# Altium footprint library pw.PcbLib: 210 footprints (part 4 of 14)
Each footprint in its own frame and in the unit in brackets; x right, y up, seen from the top. Pads: shape width x height; smd on the part's side, far side on the other; paste and mask are expansions set on the pad; w line width, h text height; cw(c..) or ccw(c..) is an arc to the next point about the centre after c.
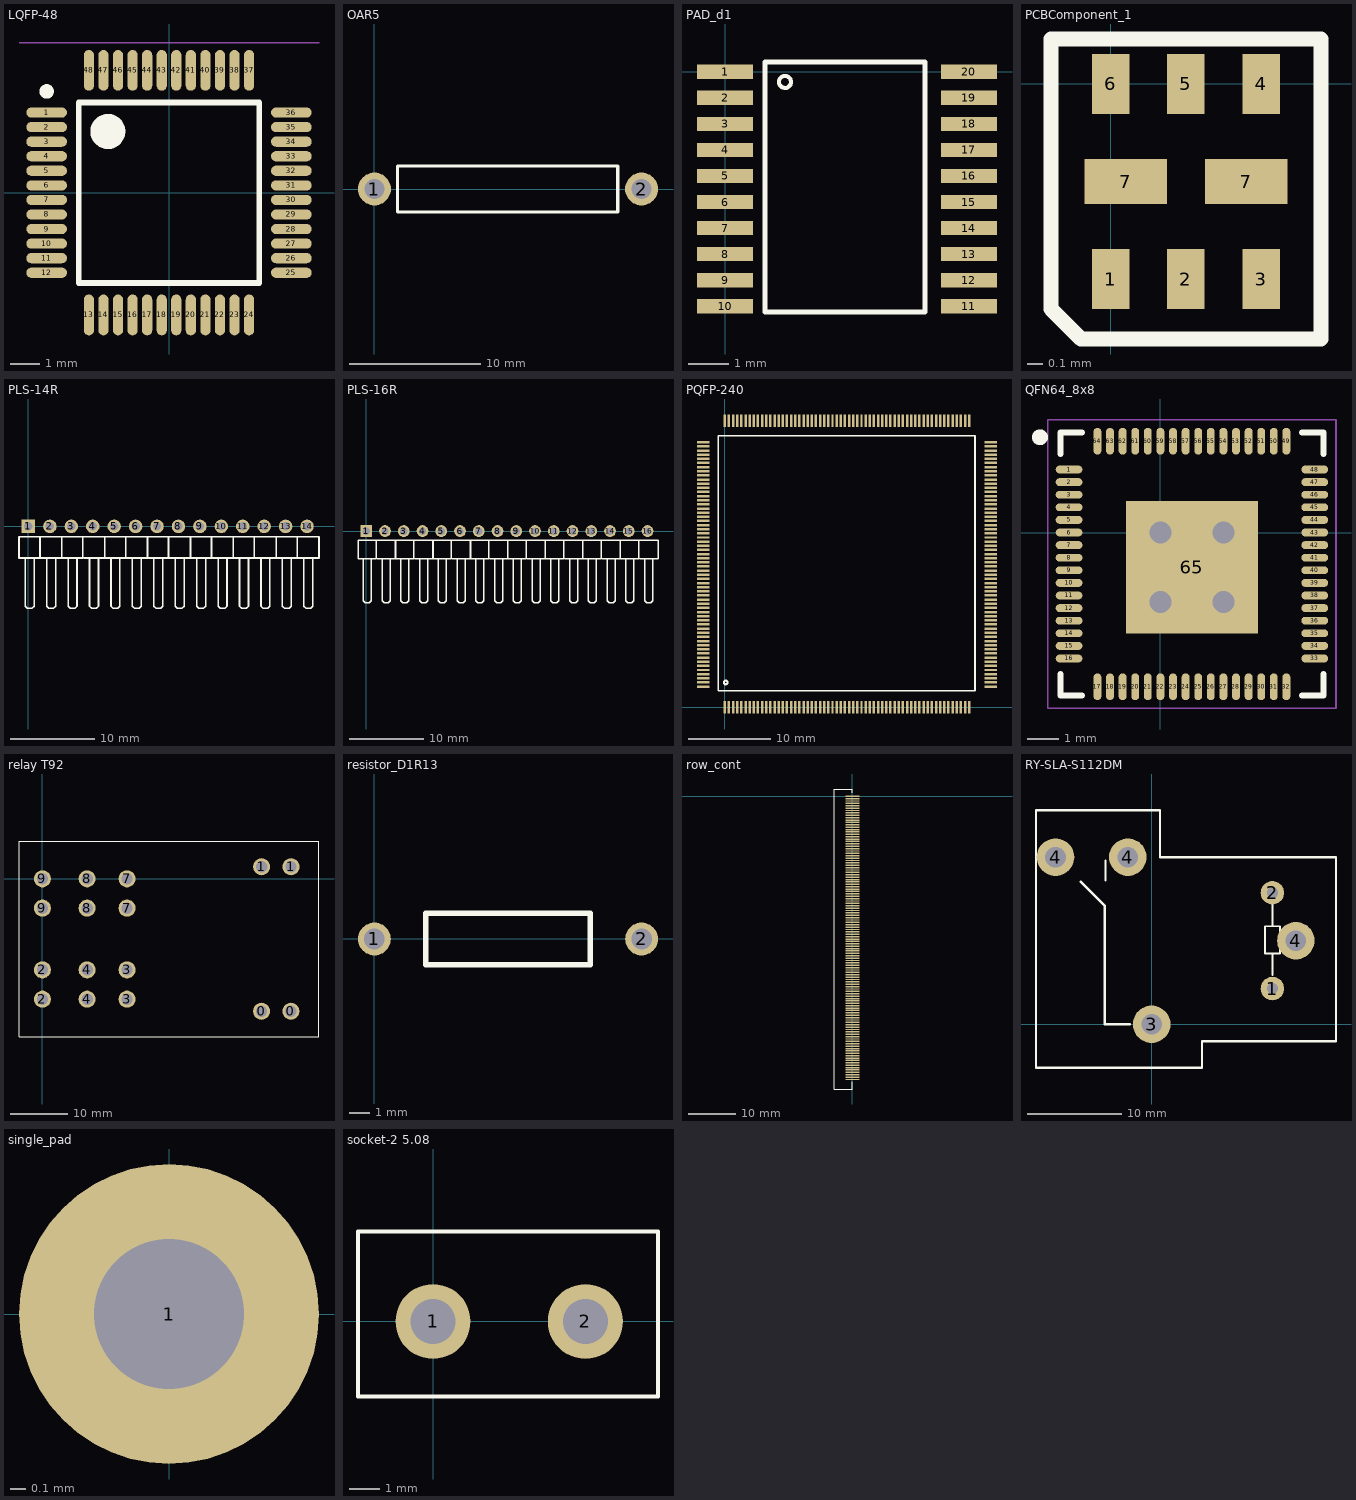
[diagram p3: the footprints below, top view; thin cyan lines are the x and y axes]

## LQFP-48 [mm] "TSQFP, 48-Leads, Body 7,00x7,00mm, Pitch 0,50mm, IPC Medium Density"
height 1.6
pads (48):
  oval 1.4x0.35 smd: 1(-4.2,2.75) 2(-4.2,2.25) 3(-4.2,1.75) 4(-4.2,1.25) 5(-4.2,0.75) 6(-4.2,0.25) 7(-4.2,-0.25) 8(-4.2,-0.75) 9(-4.2,-1.25) 10(-4.2,-1.75) 11(-4.2,-2.25) 12(-4.2,-2.75) 25(4.2,-2.75) 26(4.2,-2.25) 27(4.2,-1.75) 28(4.2,-1.25) 29(4.2,-0.75) 30(4.2,-0.25) 31(4.2,0.25) 32(4.2,0.75) 33(4.2,1.25) 34(4.2,1.75) 35(4.2,2.25) 36(4.2,2.75)
  oval 0.35x1.4 smd: 13(-2.75,-4.2) 14(-2.25,-4.2) 15(-1.75,-4.2) 16(-1.25,-4.2) 17(-0.75,-4.2) 18(-0.25,-4.2) 19(0.25,-4.2) 20(0.75,-4.2) 21(1.25,-4.2) 22(1.75,-4.2) 23(2.25,-4.2) 24(2.75,-4.2) 37(2.75,4.2) 38(2.25,4.2) 39(1.75,4.2) 40(1.25,4.2) 41(0.75,4.2) 42(0.25,4.2) 43(-0.25,4.2) 44(-0.75,4.2) 45(-1.25,4.2) 46(-1.75,4.2) 47(-2.25,4.2) 48(-2.75,4.2)
Top Overlay:
  circle w0.6: c-2.1,2.1 r0.3
  circle w0.25: c-4.2,3.475 r0.125
  lines w0.2: -3.1,-3.1 3.1,-3.1 3.1,3.1 -3.1,3.1 -3.1,-3.1
Mechanical 15:
  lines w0.05: -5.15,5.15 5.15,5.15
3D body "SW3dPS-LQFP48.STEP": height 1.5, standoff 0, extent -4.5,-4.5 4.5,4.5

## OAR5 [mm] "резистор"
pads (2):
  round 2.5 hole 1.5: 1(0,0) 2(20.3,0)
Top Overlay:
  lines w0.254: 1.75,-1.75 18.5,-1.75 18.5,1.75 7.063,1.75 1.75,1.75 1.75,-1.75
3D body "User Library-OAR5R005FLF.STEP": height 15.21, standoff -3.18, extent -0.8,-1.5 20.92,1.5

## PAD_d1 [mm] "d-1мм"
pads (20):
  rect 1.4x0.36 smd: 1(0,0) 2(0,-0.65) 3(0,-1.3) 4(0,-1.95) 5(0,-2.6) 6(0,-3.25) 7(0,-3.9) 8(0,-4.55) 9(0,-5.2) 10(0,-5.85) 11(6.095,-5.85) 12(6.095,-5.2) 13(6.095,-4.55) 14(6.095,-3.9) 15(6.095,-3.25) 16(6.095,-2.6) 17(6.095,-1.95) 18(6.095,-1.3) 19(6.095,-0.65) 20(6.095,0)
Top Overlay:
  circle w0.1: c1.5,-0.25 r0.15
  lines w0.125: 1,-6 5,-6 5,0.25 1,0.25 1,-6

## PCBComponent_1 [mm]
pads (8):
  rect 0.25x0.4 smd: 1(0,-1.3) 2(0.5,-1.3) 3(1,-1.3) 4(1,0) 5(0.5,0) 6(0,0)
  rect 0.55x0.3 smd: 7(0.1,-0.65) 7(0.9,-0.65)
Top Overlay:
  lines w0.1: -0.4,-1.5 -0.2,-1.7 1.4,-1.7 1.4,0.3 -0.4,0.3 -0.4,-1.5

## PCBComponent_1 - duplicate [mm]

## PCBComponent_1 - duplicate1 [mm]

## PLS-14R [mm]
pads (14):
  rect 1.6x1.6 hole 1: 1(0,0)
  round 1.6 hole 1: 2(2.54,0) 3(5.08,0) 4(7.62,0) 5(10.16,0) 6(12.7,0) 7(15.24,0) 8(17.78,0) 9(20.32,0) 10(22.86,0) 11(25.4,0) 12(27.94,0) 13(30.48,0) 14(33.02,0)
Top Overlay:
  lines w0.2: -1.12,-3.74 -1.12,-1.24 1.37,-1.24 1.37,-3.74 -1.08,-3.74 ; -0.38,-3.75 -0.38,-9.47 -0.13,-9.72 0.43,-9.72 0.68,-9.47 0.68,-3.75 ; 1.42,-1.24 3.96,-1.24 ; 1.46,-3.74 3.96,-3.74 ; 2.16,-3.74 2.16,-9.46 2.41,-9.71 2.97,-9.71 3.22,-9.46 3.22,-3.74 ; 4,-3.74 6.45,-3.74 6.45,-1.24 3.96,-1.24 ; 4.7,-3.75 4.7,-9.47 4.95,-9.72 5.51,-9.72 5.76,-9.47 5.76,-3.75 ; 6.5,-1.24 9.04,-1.24 ; 6.54,-3.74 9.04,-3.74 ; 7.24,-3.74 7.24,-9.46 7.49,-9.71 8.05,-9.71 8.3,-9.46 8.3,-3.74 ; 9.08,-3.74 11.53,-3.74 11.53,-1.241 9.04,-1.241 ; 9.78,-3.75 9.78,-9.47 10.03,-9.72 10.59,-9.72 10.84,-9.47 10.84,-3.75 ; 11.58,-1.241 14.12,-1.241 ; 11.62,-3.74 14.12,-3.74 ; 12.32,-3.74 12.32,-9.46 12.57,-9.71 13.13,-9.71 13.38,-9.46 13.38,-3.74 ; 14.16,-3.74 16.61,-3.74 16.61,-1.24 14.12,-1.24 ; 14.86,-3.75 14.86,-9.47 15.11,-9.72 15.67,-9.72 15.92,-9.47 15.92,-3.75 ; 16.66,-1.24 19.2,-1.24 ; 16.7,-3.74 19.2,-3.74 ; 17.4,-3.74 17.4,-9.46 17.65,-9.71 18.21,-9.71 18.46,-9.46 18.46,-3.74 ; 19.24,-3.74 21.69,-3.74 21.69,-1.24 19.2,-1.24 ; 19.94,-3.75 19.94,-9.47 20.19,-9.72 20.75,-9.72 21,-9.47 21,-3.75 ; 21.74,-1.24 24.28,-1.24 ; 21.78,-3.74 24.28,-3.74 ; 22.48,-3.74 22.48,-9.46 22.73,-9.71 23.29,-9.71 23.54,-9.46 23.54,-3.74 ; 24.32,-3.74 26.77,-3.74 26.77,-1.24 24.28,-1.24 ; 25.02,-3.75 25.02,-9.47 25.27,-9.72 25.83,-9.72 26.08,-9.47 26.08,-3.75 ; 26.82,-1.24 29.36,-1.24 ; 26.86,-3.74 29.36,-3.74 ; 27.56,-3.74 27.56,-9.46 27.81,-9.71 28.37,-9.71 28.62,-9.46 28.62,-3.74 ; 29.4,-3.74 31.85,-3.74 31.85,-1.24 29.36,-1.24 ; 30.1,-3.75 30.1,-9.47 30.35,-9.72 30.91,-9.72 31.16,-9.47 31.16,-3.75 ; 31.9,-1.24 34.44,-1.24 ; 31.94,-3.74 34.44,-3.74 ; 32.64,-3.74 32.64,-9.46 32.89,-9.71 33.45,-9.71 33.7,-9.46 33.7,-3.74 ; 3.96,-3.74 3.96,-1.24 ; 3.96,-3.74 3.96,-1.24 ; 9.04,-3.74 9.04,-1.241 ; 9.04,-3.74 9.04,-1.24 ; 14.12,-3.74 14.12,-1.24 ; 14.12,-3.74 14.12,-1.241 ; 19.2,-3.74 19.2,-1.24 ; 19.2,-3.74 19.2,-1.24 ; 24.28,-3.74 24.28,-1.24 ; 24.28,-3.74 24.28,-1.24 ; 29.36,-3.74 29.36,-1.24 ; 29.36,-3.74 29.36,-1.24 ; 34.44,-3.74 34.44,-1.24 ; 34.44,-3.74 34.44,-1.24
3D body "PLS-5R.STEP": height 2.44, standoff -3.05, extent -1.25,-9.72 11.45,0.5
3D body "PLS-5R.STEP": height 2.44, standoff -3.05, extent 11.45,-9.72 24.15,0.5
3D body "PLS-5R.STEP": height 2.44, standoff -3.05, extent 21.65,-9.72 34.35,0.5

## PLS-16R [mm]
pads (16):
  rect 1.6x1.6 hole 1: 1(0,0)
  round 1.6 hole 1: 2(2.54,0) 3(5.08,0) 4(7.62,0) 5(10.16,0) 6(12.7,0) 7(15.24,0) 8(17.78,0) 9(20.32,0) 10(22.86,0) 11(25.4,0) 12(27.94,0) 13(30.48,0) 14(33.02,0) 15(35.56,0) 16(38.1,0)
Top Overlay:
  lines w0.2: -1.12,-3.74 -1.12,-1.24 1.37,-1.24 1.37,-3.74 -1.08,-3.74 ; -0.38,-3.75 -0.38,-9.47 -0.13,-9.72 0.43,-9.72 0.68,-9.47 0.68,-3.75 ; 1.42,-1.24 3.96,-1.24 ; 1.46,-3.74 3.96,-3.74 ; 2.16,-3.74 2.16,-9.46 2.41,-9.71 2.97,-9.71 3.22,-9.46 3.22,-3.74 ; 4,-3.74 6.45,-3.74 6.45,-1.24 3.96,-1.24 ; 4.7,-3.75 4.7,-9.47 4.95,-9.72 5.51,-9.72 5.76,-9.47 5.76,-3.75 ; 6.5,-1.24 9.04,-1.24 ; 6.54,-3.74 9.04,-3.74 ; 7.24,-3.74 7.24,-9.46 7.49,-9.71 8.05,-9.71 8.3,-9.46 8.3,-3.74 ; 9.08,-3.74 11.53,-3.74 11.53,-1.241 9.04,-1.241 ; 9.78,-3.75 9.78,-9.47 10.03,-9.72 10.59,-9.72 10.84,-9.47 10.84,-3.75 ; 11.58,-1.241 14.12,-1.241 ; 11.62,-3.74 14.12,-3.74 ; 12.32,-3.74 12.32,-9.46 12.57,-9.71 13.13,-9.71 13.38,-9.46 13.38,-3.74 ; 14.16,-3.74 16.61,-3.74 16.61,-1.24 14.12,-1.24 ; 14.86,-3.75 14.86,-9.47 15.11,-9.72 15.67,-9.72 15.92,-9.47 15.92,-3.75 ; 16.66,-1.24 19.2,-1.24 ; 16.7,-3.74 19.2,-3.74 ; 17.4,-3.74 17.4,-9.46 17.65,-9.71 18.21,-9.71 18.46,-9.46 18.46,-3.74 ; 19.24,-3.74 21.69,-3.74 21.69,-1.24 19.2,-1.24 ; 19.94,-3.75 19.94,-9.47 20.19,-9.72 20.75,-9.72 21,-9.47 21,-3.75 ; 21.74,-1.24 24.28,-1.24 ; 21.78,-3.74 24.28,-3.74 ; 22.48,-3.74 22.48,-9.46 22.73,-9.71 23.29,-9.71 23.54,-9.46 23.54,-3.74 ; 24.32,-3.74 26.77,-3.74 26.77,-1.24 24.28,-1.24 ; 25.02,-3.75 25.02,-9.47 25.27,-9.72 25.83,-9.72 26.08,-9.47 26.08,-3.75 ; 26.82,-1.24 29.36,-1.24 ; 26.86,-3.74 29.36,-3.74 ; 27.56,-3.74 27.56,-9.46 27.81,-9.71 28.37,-9.71 28.62,-9.46 28.62,-3.74 ; 29.4,-3.74 31.85,-3.74 31.85,-1.24 29.36,-1.24 ; 30.1,-3.75 30.1,-9.47 30.35,-9.72 30.91,-9.72 31.16,-9.47 31.16,-3.75 ; 31.9,-1.24 34.44,-1.24 ; 31.94,-3.74 34.44,-3.74 ; 32.64,-3.74 32.64,-9.46 32.89,-9.71 33.45,-9.71 33.7,-9.46 33.7,-3.74 ; 34.48,-3.74 36.93,-3.74 36.93,-1.24 34.44,-1.24 ; 35.18,-3.75 35.18,-9.47 35.43,-9.72 35.99,-9.72 36.24,-9.47 36.24,-3.75 ; 36.98,-1.24 39.52,-1.24 39.52,-3.74 37.02,-3.74 ; 37.72,-3.74 37.72,-9.46 37.97,-9.71 38.53,-9.71 38.78,-9.46 38.78,-3.74 ; 3.96,-3.74 3.96,-1.24 ; 3.96,-3.74 3.96,-1.24 ; 9.04,-3.74 9.04,-1.24 ; 9.04,-3.74 9.04,-1.241 ; 14.12,-3.74 14.12,-1.241 ; 14.12,-3.74 14.12,-1.24 ; 19.2,-3.74 19.2,-1.24 ; 19.2,-3.74 19.2,-1.24 ; 24.28,-3.74 24.28,-1.24 ; 24.28,-3.74 24.28,-1.24 ; 29.36,-3.74 29.36,-1.24 ; 29.36,-3.74 29.36,-1.24 ; 34.44,-3.74 34.44,-1.24 ; 34.44,-3.74 34.44,-1.24
3D body "PLS-5R.STEP": height 2.44, standoff -3.05, extent 26.75,-9.72 39.45,0.5
3D body "PLS-5R.STEP": height 2.44, standoff -3.05, extent 24.15,-9.72 36.85,0.5
3D body "PLS-5R.STEP": height 2.44, standoff -3.05, extent 11.45,-9.72 24.15,0.5
3D body "PLS-5R.STEP": height 2.44, standoff -3.05, extent -1.25,-9.72 11.45,0.5

## PQFP-240 [mm]
pads (240):
  rect 1.524x0.3 smd: 1(-2.6,2.5) 1(-2.6,3) 1(-2.6,3.5) 1(-2.6,4) 1(-2.6,4.5) 1(-2.6,5) 1(-2.6,5.5) 1(-2.6,6) 1(-2.6,6.5) 1(-2.6,7) 1(-2.6,7.5) 1(-2.6,8) 1(-2.6,8.5) 1(-2.6,9) 1(-2.6,9.5) 1(-2.6,10) 1(-2.6,10.5) 1(-2.6,11) 1(-2.6,11.5) 1(-2.6,12) 1(-2.6,12.5) 1(-2.6,13) 1(-2.6,13.5) 1(-2.6,14) 1(-2.6,14.5) 1(-2.6,15) 1(-2.6,15.5) 1(-2.6,16) 1(-2.6,16.5) 1(-2.6,17) 1(-2.6,17.5) 1(-2.6,18) 1(-2.6,18.5) 1(-2.6,19) 1(-2.6,19.5) 1(-2.6,20) 1(-2.6,20.5) 1(-2.6,21) 1(-2.6,21.5) 1(-2.6,22) 1(-2.6,22.5) 1(-2.6,23) 1(-2.6,23.5) 1(-2.6,24) 1(-2.6,24.5) 1(-2.6,25) 1(-2.6,25.5) 1(-2.6,26) 1(-2.6,26.5) 1(-2.6,27) 1(-2.6,27.5) 1(-2.6,28) 1(-2.6,28.5) 1(-2.6,29) 1(-2.6,29.5) 1(-2.6,30) 1(-2.6,30.5) 1(-2.6,31) 1(-2.6,31.5) 1(-2.6,32) 1(32.1,2.5) 1(32.1,3) 1(32.1,3.5) 1(32.1,4) 1(32.1,4.5) 1(32.1,5) 1(32.1,5.5) 1(32.1,6) 1(32.1,6.5) 1(32.1,7) 1(32.1,7.5) 1(32.1,8) 1(32.1,8.5) 1(32.1,9) 1(32.1,9.5) 1(32.1,10) 1(32.1,10.5) 1(32.1,11) 1(32.1,11.5) 1(32.1,12) 1(32.1,12.5) 1(32.1,13) 1(32.1,13.5) 1(32.1,14) 1(32.1,14.5) 1(32.1,15) 1(32.1,15.5) 1(32.1,16) 1(32.1,16.5) 1(32.1,17) 1(32.1,17.5) 1(32.1,18) 1(32.1,18.5) 1(32.1,19) 1(32.1,19.5) 1(32.1,20) 1(32.1,20.5) 1(32.1,21) 1(32.1,21.5) 1(32.1,22) 1(32.1,22.5) 1(32.1,23) 1(32.1,23.5) 1(32.1,24) 1(32.1,24.5) 1(32.1,25) 1(32.1,25.5) 1(32.1,26) 1(32.1,26.5) 1(32.1,27) 1(32.1,27.5) 1(32.1,28) 1(32.1,28.5) 1(32.1,29) 1(32.1,29.5) 1(32.1,30) 1(32.1,30.5) 1(32.1,31) 1(32.1,31.5) 1(32.1,32)
  rect 0.3x1.524 smd: 1(0,0) 1(0,34.6) 1(0.5,0) 1(0.5,34.6) 1(1,0) 1(1,34.6) 1(1.5,0) 1(1.5,34.6) 1(2,0) 1(2,34.6) 1(2.5,0) 1(2.5,34.6) 1(3,0) 1(3,34.6) 1(3.5,0) 1(3.5,34.6) 1(4,0) 1(4,34.6) 1(4.5,0) 1(4.5,34.6) 1(5,0) 1(5,34.6) 1(5.5,0) 1(5.5,34.6) 1(6,0) 1(6,34.6) 1(6.5,0) 1(6.5,34.6) 1(7,0) 1(7,34.6) 1(7.5,0) 1(7.5,34.6) 1(8,0) 1(8,34.6) 1(8.5,0) 1(8.5,34.6) 1(9,0) 1(9,34.6) 1(9.5,0) 1(9.5,34.6) 1(10,0) 1(10,34.6) 1(10.5,0) 1(10.5,34.6) 1(11,0) 1(11,34.6) 1(11.5,0) 1(11.5,34.6) 1(12,0) 1(12,34.6) 1(12.5,0) 1(12.5,34.6) 1(13,0) 1(13,34.6) 1(13.5,0) 1(13.5,34.6) 1(14,0) 1(14,34.6) 1(14.5,0) 1(14.5,34.6) 1(15,0) 1(15,34.6) 1(15.5,0) 1(15.5,34.6) 1(16,0) 1(16,34.6) 1(16.5,0) 1(16.5,34.6) 1(17,0) 1(17,34.6) 1(17.5,0) 1(17.5,34.6) 1(18,0) 1(18,34.6) 1(18.5,0) 1(18.5,34.6) 1(19,0) 1(19,34.6) 1(19.5,0) 1(19.5,34.6) 1(20,0) 1(20,34.6) 1(20.5,0) 1(20.5,34.6) 1(21,0) 1(21,34.6) 1(21.5,0) 1(21.5,34.6) 1(22,0) 1(22,34.6) 1(22.5,0) 1(22.5,34.6) 1(23,0) 1(23,34.6) 1(23.5,0) 1(23.5,34.6) 1(24,0) 1(24,34.6) 1(24.5,0) 1(24.5,34.6) 1(25,0) 1(25,34.6) 1(25.5,0) 1(25.5,34.6) 1(26,0) 1(26,34.6) 1(26.5,0) 1(26.5,34.6) 1(27,0) 1(27,34.6) 1(27.5,0) 1(27.5,34.6) 1(28,0) 1(28,34.6) 1(28.5,0) 1(28.5,34.6) 1(29,0) 1(29,34.6) 1(29.5,0) 1(29.5,34.6)
Top Overlay:
  circle w0.254: c0.1,3 r0.224
  lines w0.2: -0.8,2 30.2,2 30.2,32.8 -0.8,32.8 -0.8,2
3D body "User Library-IPC QFP24QFP50P3460X3460X415-240N  240 MQFP.STEP": height 4.3, standoff 0, extent -2.6,-0.1 32.056,34.556

## QFN64_8x8 [mm] "micrel"
height 0.85
pads (65):
  oval 0.85x0.25 smd: 1(-2.9,2) 2(-2.9,1.6) 3(-2.9,1.2) 4(-2.9,0.8) 5(-2.9,0.4) 6(-2.9,0) 7(-2.9,-0.4) 8(-2.9,-0.8) 9(-2.9,-1.2) 10(-2.9,-1.6) 11(-2.9,-2) 12(-2.9,-2.4) 13(-2.9,-2.8) 14(-2.9,-3.2) 15(-2.9,-3.6) 16(-2.9,-4) 33(4.9,-4) 34(4.9,-3.6) 35(4.9,-3.2) 36(4.9,-2.8) 37(4.9,-2.4) 38(4.9,-2) 39(4.9,-1.6) 40(4.9,-1.2) 41(4.9,-0.8) 42(4.9,-0.4) 43(4.9,0) 44(4.9,0.4) 45(4.9,0.8) 46(4.9,1.2) 47(4.9,1.6) 48(4.9,2)
  oval 0.25x0.85 smd: 17(-2,-4.9) 18(-1.6,-4.9) 19(-1.2,-4.9) 20(-0.8,-4.9) 21(-0.4,-4.9) 22(0,-4.9) 23(0.4,-4.9) 24(0.8,-4.9) 25(1.2,-4.9) 26(1.6,-4.9) 27(2,-4.9) 28(2.4,-4.9) 29(2.8,-4.9) 30(3.2,-4.9) 31(3.6,-4.9) 32(4,-4.9) 49(4,2.9) 50(3.6,2.9) 51(3.2,2.9) 52(2.8,2.9) 53(2.4,2.9) 54(2,2.9) 55(1.6,2.9) 56(1.2,2.9) 57(0.8,2.9) 58(0.4,2.9) 59(0,2.9) 60(-0.4,2.9) 61(-0.8,2.9) 62(-1.2,2.9) 63(-1.6,2.9) 64(-2,2.9)
  rect 4.2x4.2 smd: 65(1,-1.1)
via 0,0 diameter 1.3 hole 0.7
via 2,0 diameter 1.3 hole 0.7
via 2,-2.2 diameter 1.3 hole 0.7
via 0,-2.2 diameter 1.3 hole 0.7
Top Overlay:
  circle w0.25: c-3.825,3.025 r0.125
  lines w0.2: -3.175,-4.5 -3.175,-5.175 -2.5,-5.175 ; -3.175,2.5 -3.175,3.175 -2.5,3.175 ; 4.5,-5.175 5.175,-5.175 5.175,-4.5 ; 4.5,3.175 5.175,3.175 5.175,2.5
Mechanical 15:
  lines w0.05: -3.575,-5.575 5.575,-5.575 5.575,3.575 -3.575,3.575 -3.575,-5.575
  lines w0.1: 0.5,-1 1.5,-1 ; 1,-1.5 1,-0.5
3D body "User Library-QFN 64 8x8.STEP": height 0.8, standoff -0.05, extent -2.952,-4.975 5.05,3.027

## relay T92 [mm]
pads (16):
  round 3 hole 2: 0(38.5,-23.28) 0(43.66,-23.28) 1(38.52,2.12) 1(43.68,2.12) 2(0,-21.16) 2(0,-16) 3(14.86,-21.16) 3(14.86,-16) 4(7.85,-21.16) 4(7.85,-16) 7(14.86,-5.16) 7(14.86,0) 8(7.85,-5.16) 8(7.85,0) 9(0,-5.16) 9(0,0)
Top Overlay:
  lines w0.2: 48.58,6.62 48.58,-27.78 -4.12,-27.78 -4.12,6.62 48.6,6.62
3D body "66f3421_t92s7a12-240.stp": height 31.42, standoff -3.28, extent -3.762,-27.972 48.562,6.572

## resistor_D1R13 [mm]
pads (2):
  round 1.6 hole 1: 1(0,0) 2(13,0)
Top Overlay:
  lines w0.254: 2.5,-1.25 2.5,1.25 10.5,1.25 10.5,-1.25 2.5,-1.25

## row_cont [mm]
pads (120):
  rect 3x0.3 smd: 1(0,-59.5) 1(0,-59) 1(0,-58.5) 1(0,-58) 1(0,-57.5) 1(0,-57) 1(0,-56.5) 1(0,-56) 1(0,-55.5) 1(0,-55) 1(0,-54.5) 1(0,-54) 1(0,-53.5) 1(0,-53) 1(0,-52.5) 1(0,-52) 1(0,-51.5) 1(0,-51) 1(0,-50.5) 1(0,-50) 1(0,-49.5) 1(0,-49) 1(0,-48.5) 1(0,-48) 1(0,-47.5) 1(0,-47) 1(0,-46.5) 1(0,-46) 1(0,-45.5) 1(0,-45) 1(0,-44.5) 1(0,-44) 1(0,-43.5) 1(0,-43) 1(0,-42.5) 1(0,-42) 1(0,-41.5) 1(0,-41) 1(0,-40.5) 1(0,-40) 1(0,-39.5) 1(0,-39) 1(0,-38.5) 1(0,-38) 1(0,-37.5) 1(0,-37) 1(0,-36.5) 1(0,-36) 1(0,-35.5) 1(0,-35) 1(0,-34.5) 1(0,-34) 1(0,-33.5) 1(0,-33) 1(0,-32.5) 1(0,-32) 1(0,-31.5) 1(0,-31) 1(0,-30.5) 1(0,-30) 1(0,-29.5) 1(0,-29) 1(0,-28.5) 1(0,-28) 1(0,-27.5) 1(0,-27) 1(0,-26.5) 1(0,-26) 1(0,-25.5) 1(0,-25) 1(0,-24.5) 1(0,-24) 1(0,-23.5) 1(0,-23) 1(0,-22.5) 1(0,-22) 1(0,-21.5) 1(0,-21) 1(0,-20.5) 1(0,-20) 1(0,-19.5) 1(0,-19) 1(0,-18.5) 1(0,-18) 1(0,-17.5) 1(0,-17) 1(0,-16.5) 1(0,-16) 1(0,-15.5) 1(0,-15) 1(0,-14.5) 1(0,-14) 1(0,-13.5) 1(0,-13) 1(0,-12.5) 1(0,-12) 1(0,-11.5) 1(0,-11) 1(0,-10.5) 1(0,-10) 1(0,-9.5) 1(0,-9) 1(0,-8.5) 1(0,-8) 1(0,-7.5) 1(0,-7) 1(0,-6.5) 1(0,-6) 1(0,-5.5) 1(0,-5) 1(0,-4.5) 1(0,-4) 1(0,-3.5) 1(0,-3) 1(0,-2.5) 1(0,-2) 1(0,-1.5) 1(0,-1) 1(0,-0.5) 1(0,0)
Top Overlay:
  lines w0.2: 0,-60 0,-61.5 -3.8,-61.5 -3.8,1.52 0,1.52 0,0.76

## RY-SLA-S112DM [mm] "реле"
pads (6):
  round 2.5 hole 1.2: 1(12.86,3.8) 2(12.86,14)
  round 4 hole 2.2: 3(0,0) 4(-10.24,17.8) 4(-2.54,17.8) 4(15.36,8.9)
Top Overlay:
  lines w0.2: -12.319,-4.648 -12.319,22.809 ; -4.902,15.291 -4.902,17.453 ; 12.874,5.244 12.874,7.519 ; 12.874,10.444 12.874,12.744 ; 19.634,-1.829 19.634,17.78 ; 12.074,7.519 12.074,10.444 13.674,10.444 13.674,7.519 12.074,7.519
  lines w0.254: -12.319,-4.648 5.359,-4.648 5.359,-1.829 19.634,-1.829 ; -12.319,22.809 0.889,22.809 0.889,17.78 19.634,17.78 ; -7.57,15.2 -4.978,12.608 -4.978,0 -2.337,0
3D body "User Library-RELAY-RT1-24-30-A.STEP": height 20.2, standoff -2.8, extent -12.5,-4.5 19.5,22.5

## single_pad [mm]
pads (1):
  round 2 hole 1: 1(0,0)

## socket-2 5.08 [mm]
pads (2):
  round 2.5 hole 1.5: 1(0,0) 2(5.08,0)
Top Overlay:
  lines w0.125: -2.5,-2.5 -2.5,3 7.5,3 7.5,-2.5 -2.5,-2.5
3D body "User Library-2 Way PCB Screw Terminal Block 5_08mm.STEP": height 15.2, standoff -3.5, extent -2.58,-4.25 7.58,4.75